# Altium footprint library lib_datalogger.PcbLib: 866 footprints (part 21 of 55)
Each footprint in its own frame and in the unit in brackets; x right, y up, seen from the top. Pads: shape width x height; smd on the part's side, far side on the other; paste and mask are expansions set on the pad; w line width, h text height; cw(c..) or ccw(c..) is an arc to the next point about the centre after c.
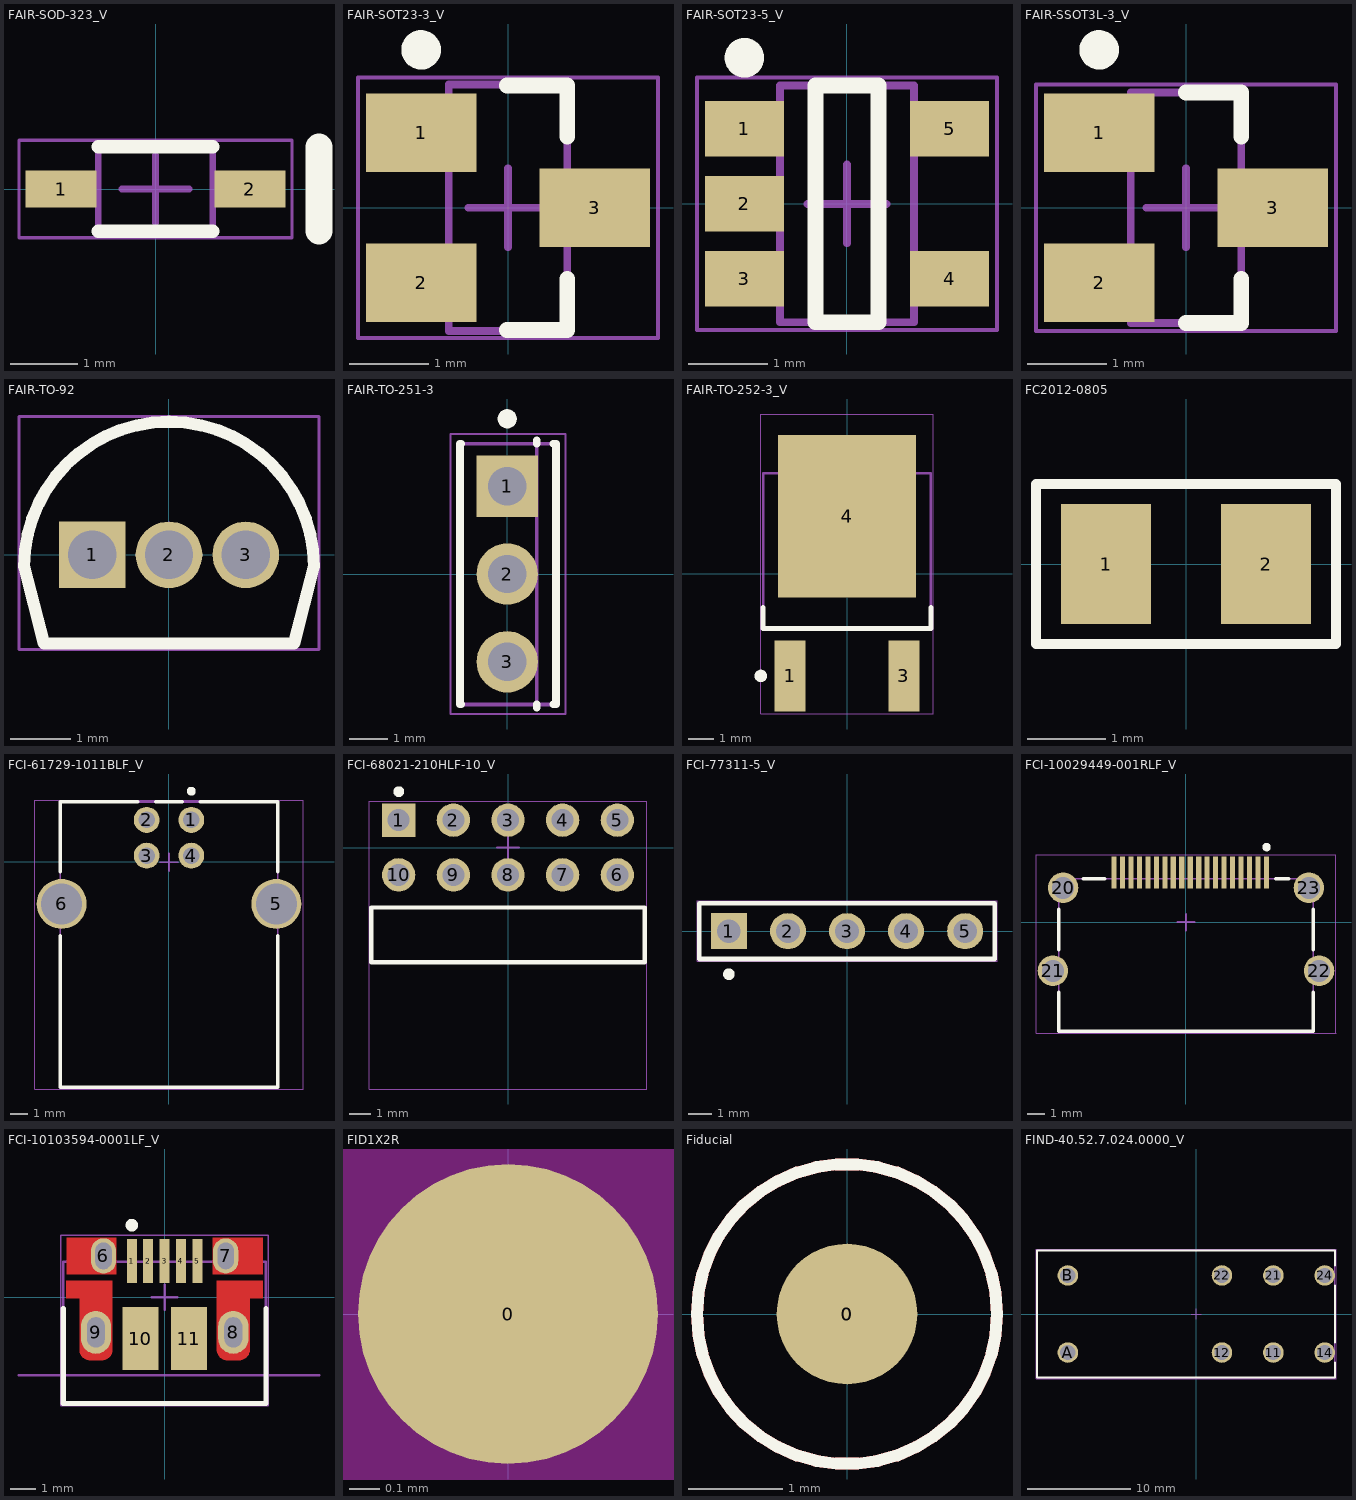
[diagram p20: the footprints below, top view; thin cyan lines are the x and y axes]

## FAIR-SOD-323_V [mm] "SODFL, 2-Leads, Body 1.25x1.7mm"
height 1
pads (2):
  rect 1.05x0.55 smd: 1(-1.4,0) 2(1.4,0)
Top Overlay:
  lines w0.2: -0.85,-0.625 0.85,-0.625 ; -0.85,0.625 0.85,0.625
  lines w0.4: 2.425,-0.625 2.425,0.625
Mechanical 13:
  lines w0.1: -0.85,-0.625 -0.85,0.625 0.85,0.625 0.85,-0.625 -0.85,-0.625
Mechanical 15:
  lines w0.05: -2.025,-0.725 -2.025,0.725 2.025,0.725 2.025,-0.725 -2.025,-0.725
  lines w0.1: -0.5,0 0.5,0 ; 0,-0.5 0,0.5
3D body "SODFL250X100-2L.step": height 1, standoff 0, extent -1.25,-0.625 1.25,0.625

## FAIR-SOT23-3_V [mm] "SOT23, 3-Leads, Body 3.12x1.5mm, Pitch 0.95mm"
height 1.2
pads (3):
  rect 1.4x1 smd: 1(-1.1,0.95) 2(-1.1,-0.95) 3(1.1,0)
Top Overlay:
  circle w0.25: c-1.1,2 r0.125
  lines w0.2: -0.013,-1.55 0.75,-1.55 0.75,-0.9 ; -0.013,1.55 0.75,1.55 0.75,0.9
Mechanical 13:
  lines w0.1: -0.75,-1.56 -0.75,1.56 0.75,1.56 0.75,-1.56 -0.75,-1.56
Mechanical 15:
  lines w0.05: -1.9,-1.65 -1.9,1.65 1.9,1.65 1.9,-1.65 -1.9,-1.65
  lines w0.1: -0.5,0 0.5,0 ; 0,-0.5 0,0.5
3D body "SOT95P240X120-3L.step": height 1.2, standoff 0, extent -1.35,-1.56 1.35,1.56

## FAIR-SOT23-5_V [mm] "SOT23, 5-Leads, Body 3x1.7mm, Pitch 0.95mm"
height 1.45
pads (5):
  rect 1x0.7 smd: 1(-1.3,0.95) 2(-1.3,0) 3(-1.3,-0.95) 4(1.3,-0.95) 5(1.3,0.95)
Top Overlay:
  circle w0.25: c-1.3,1.85 r0.125
  lines w0.2: -0.4,-1.5 -0.4,1.5 0.4,1.5 0.4,-1.5 -0.4,-1.5
Mechanical 13:
  lines w0.1: -0.85,-1.5 0.85,-1.5 0.85,1.5 -0.85,1.5 -0.85,-1.5
Mechanical 15:
  lines w0.05: -1.9,-1.6 1.9,-1.6 1.9,1.6 -1.9,1.6 -1.9,-1.6
  lines w0.1: -0.5,0 0.5,0 ; 0,-0.5 0,0.5
3D body "SOT95P280X145-5L.step": height 1.45, standoff 0, extent -1.5,-1.5 1.5,1.5

## FAIR-SSOT3L-3_V [mm] "SOT23, 3-Leads, Body 2.92x1.4mm, Pitch 0.95mm"
height 1.12
pads (3):
  rect 1.4x1 smd: 1(-1.1,0.95) 2(-1.1,-0.95) 3(1.1,0)
Top Overlay:
  circle w0.25: c-1.1,2 r0.125
  lines w0.2: 0,-1.46 0.7,-1.46 0.7,-0.9 ; 0,1.46 0.7,1.46 0.7,0.9
Mechanical 13:
  lines w0.1: -0.7,-1.46 -0.7,1.46 0.7,1.46 0.7,-1.46 -0.7,-1.46
Mechanical 15:
  lines w0.05: -1.9,-1.56 -1.9,1.56 1.9,1.56 1.9,-1.56 -1.9,-1.56
  lines w0.1: -0.5,0 0.5,0 ; 0,-0.5 0,0.5
3D body "FAIR-SSOT3L-3_V.stp": height 1.12, standoff 0, extent -1.26,-1.46 1.26,1.46

## FAIR-TO-92 [mm] "TO, 3-Leads, Body Dia 4.79mm, Pitch 1.27mm"
height 5.33
pads (3):
  rect 1.1x1.1 hole 0.8: 1(-1.27,0)
  round 1.1 hole 0.8: 2(0,0) 3(1.27,0)
Top Overlay:
  lines w0.2: -2.395,-0.195 cw(c0,-0.195) 2.395,-0.195 2.065,-1.47 -2.065,-1.47 -2.395,-0.195
Mechanical 13:
  lines w0.1: -2.065,-1.47 2.065,-1.47 ; -2.065,-1.47 -2.395,-0.195 cw(c0,-0.195) 2.395,-0.195 2.065,-1.47
Mechanical 15:
  lines w0.05: -2.48,-1.57 -2.48,2.285 2.48,2.285 2.48,-1.57 -2.48,-1.57
  lines w0.1: -0.5,0 0.5,0 ; 0,-0.5 0,0.5
3D body "TO-92.stp": height 4.82, standoff -14.41, extent -2.38,-1.47 2.38,2.185

## FAIR-TO-251-3 [mm] "FM, 3-Leads, Body 6.8x2.5mm, Pitch 2.29mm"
height 9.7
pads (3):
  rect 1.6x1.6 hole 1: 1(0,2.29)
  round 1.6 hole 1: 2(0,0) 3(0,-2.29)
Top Overlay:
  circle w0.25: c0,4.05 r0.125
  lines w0.2: -1.2,-3.4 -1.23,-3.4 -1.23,3.4 -1.2,3.4 ; 0.77,-3.49 0.77,-3.4 ; 0.77,3.4 0.77,3.49 ; 1.2,-3.4 1.27,-3.4 1.27,3.4 1.2,3.4
Mechanical 13:
  lines w0.1: 0.77,-3.4 0.77,3.4 ; -1.23,-3.4 1.27,-3.4 1.27,3.4 -1.23,3.4 -1.23,-3.4
Mechanical 15:
  lines w0.05: -1.48,-3.65 1.52,-3.65 1.52,3.65 -1.48,3.65 -1.48,-3.65
  lines w0.1: -0.5,0 0.5,0 ; 0,-0.5 0,0.5
3D body: height 9.7, standoff 8.8, extent 0.77,-2.675 1.27,2.675
3D body: height 8.8, standoff 1.6, extent -1.23,-3.4 1.27,3.4
3D body: height 0, standoff -1.6, extent -0.25,-2.67 0.25,-1.91
3D body: height 1.6, standoff 0, extent -0.25,-2.765 0.25,-1.815
3D body: height 0, standoff -1.6, extent -0.25,-0.38 0.25,0.38
3D body: height 1.6, standoff 0, extent -0.25,-0.475 0.25,0.475
3D body: height 0, standoff -1.6, extent -0.25,1.91 0.25,2.67
3D body: height 1.6, standoff 0, extent -0.25,1.815 0.25,2.765

## FAIR-TO-252-3_V [mm] "D-PAK, 3-Leads, Body 6.22x6.73mm, Pitch 2.28mm"
height 2.39
pads (3):
  rect 1.25x2.85 smd: 1(-2.28,-4.1) 3(2.28,-4.1)
  rect 5.55x6.5 smd: 4(0,2.3)
Top Overlay:
  circle w0.25: c-3.455,-4.1 r0.125
  lines w0.2: -3.365,-1.35 -3.365,-2.2 3.365,-2.2 3.365,-1.35
Mechanical 13:
  lines w0.1: -3.365,-2.2 -3.365,4.02 3.365,4.02 3.365,-2.2 -3.365,-2.2
Mechanical 15:
  lines w0.05: -3.465,-5.625 -3.465,6.4 3.465,6.4 3.465,-5.625 -3.465,-5.625
  lines w0.1: -0.5,0 0.5,0 ; 0,-0.5 0,0.5
3D body "DPAK229P991X239-3L.step": height 2.39, standoff 0, extent -3.365,-3.555 3.365,6.35

## FC2012-0805 [mil] "Ferrite Chip"
height 33.46
pads (2):
  rect 45x60 smd: 1(-40,0) 2(40,0)
Top Overlay:
  lines w5: -75,-40 -75,40 75,40 75,-40 -75,-40
3D body "User Library-ind_0805.STEP": height 37.4, standoff 0, extent -39.37,-23.62 39.37,23.63

## FCI-61729-1011BLF_V [mm] "THD, 4-Leads, Body 16x12.2mm"
height 11.5
pads (6):
  round 1.45 hole 0.92: 1(1.25,2.355) 2(-1.25,2.355) 3(-1.25,0.355) 4(1.25,0.355)
  round 2.8 hole 2.3: 5(6.02,-2.355) 6(-6.02,-2.355)
Top Overlay:
  circle w0.25: c1.25,3.965 r0.125
  lines w0.2: -6.1,-4.153 -6.1,-12.635 6.1,-12.635 6.1,-4.153 ; -6.1,-0.557 -6.1,3.365 -1.746,3.365 ; -0.75,3.365 0.75,3.365 ; 1.75,3.365 6.1,3.365 6.1,-0.557
Mechanical 13:
  lines w0.1: -6.1,-12.635 6.1,-12.635 6.1,3.365 -6.1,3.365 -6.1,-12.635
Mechanical 15:
  lines w0.05: -7.52,-12.735 7.52,-12.735 7.52,3.465 -7.52,3.465 -7.52,-12.735
  lines w0.1: -0.5,-0.02 0.5,-0.02 ; 0,-0.52 0,0.48
3D body "User Library-i61729-xxxxx_cust.STEP": height 11, standoff -2.8, extent -6.56,-12.575 6.56,3.365

## FCI-68021-210HLF-10_V [mm] "THD, 10-Leads, Body 12.7x2.54mm, Pitch 2.54mm"
height 4.83
pads (10):
  rect 1.55x1.55 hole 1.02: 1(-5.08,1.27)
  round 1.55 hole 1.02: 2(-2.54,1.27) 3(0,1.27) 4(2.54,1.27) 5(5.08,1.27) 6(5.08,-1.27) 7(2.54,-1.27) 8(0,-1.27) 9(-2.54,-1.27) 10(-5.08,-1.27)
Top Overlay:
  circle w0.25: c-5.08,2.595 r0.125
  lines w0.2: -6.35,-5.33 -6.35,-2.79 6.35,-2.79 6.35,-5.33 -6.35,-5.33
Mechanical 13:
  lines w0.1: -6.35,-5.33 -6.35,-2.79 6.35,-2.79 6.35,-5.33 -6.35,-5.33
Mechanical 15:
  lines w0.05: -6.45,-11.225 6.45,-11.225 6.45,2.145 -6.45,2.145 -6.45,-11.225
  lines w0.1: -0.5,0 0.5,0 ; 0,-0.5 0,0.5
3D body "User Library-68021-x10.STEP": height 4.83, standoff -3.06, extent -6.32,-11.125 6.32,1.638

## FCI-77311-5_V [mm] "THD, 5-Leads, Body 12.7x2.4mm, Pitch 2.54mm"
height 16.24
pads (5):
  rect 1.55x1.55 hole 1.02: 1(-5.08,0)
  round 1.55 hole 1.02: 2(-2.54,0) 3(0,0) 4(2.54,0) 5(5.08,0)
Top Overlay:
  circle w0.25: c-5.08,-1.85 r0.125
  lines w0.2: -6.35,-1.2 6.35,-1.2 6.35,1.2 -6.35,1.2 -6.35,-1.2
Mechanical 13:
  lines w0.1: -6.35,-1.2 -6.35,1.2 6.35,1.2 6.35,-1.2 -6.35,-1.2
Mechanical 15:
  lines w0.05: -6.45,-1.3 6.45,-1.3 6.45,1.3 -6.45,1.3 -6.45,-1.3
  lines w0.1: -0.5,0 0.5,0 ; 0,-0.5 0,0.5
3D body: height 2.54, standoff 0, extent -6.35,-1.2 6.35,1.2
3D body: height 16.24, standoff -3.05, extent -0.31,-0.31 0.31,0.31
3D body: height 16.24, standoff -3.05, extent -2.85,-0.31 -2.23,0.31
3D body: height 16.24, standoff -3.05, extent -5.39,-0.31 -4.77,0.31
3D body: height 16.24, standoff -3.05, extent 2.23,-0.31 2.85,0.31
3D body: height 16.24, standoff -3.05, extent 4.77,-0.31 5.39,0.31

## FCI-10029449-001RLF_V [mm] "SMD, 19-Leads, Body 15x9mm, Pitch 0.5mm"
height 6.3
pads (23):
  rect 0.3x1.9 smd: 1(4.75,2.925) 2(4.25,2.925) 3(3.75,2.925) 4(3.25,2.925) 5(2.75,2.925) 6(2.25,2.925) 7(1.75,2.925) 8(1.25,2.925) 9(0.75,2.925) 10(0.25,2.925) 11(-0.25,2.925) 12(-0.75,2.925) 13(-1.25,2.925) 14(-1.75,2.925) 15(-2.25,2.925) 16(-2.75,2.925) 17(-3.25,2.925) 18(-3.75,2.925) 19(-4.25,2.925)
  round 1.8 hole 1.3: 20(-7.25,2.025) 21(-7.85,-2.875) 22(7.85,-2.875) 23(7.25,2.025)
Top Overlay:
  circle w0.25: c4.75,4.425 r0.125
  lines w0.2: -7.5,-4.127 -7.5,-6.445 7.5,-6.445 7.5,-4.127 ; -7.5,-1.623 -7.5,0.749 ; -6.063,2.555 -4.8,2.555 ; 5.3,2.555 6.063,2.555 ; 7.5,-1.623 7.5,0.749
Mechanical 13:
  lines w0.1: -7.5,-6.445 7.5,-6.445 7.5,2.555 -7.5,2.555 -7.5,-6.445
Mechanical 15:
  lines w0.05: -8.85,-6.545 -8.85,3.975 8.85,3.975 8.85,-6.545 -8.85,-6.545
  lines w0.1: -0.5,0 0.5,0 ; 0,-0.5 0,0.5
3D body "10029449-001LF.stp": height 6.11, standoff -1.89, extent -8.1,-6.445 8.1,3.455

## FCI-10103594-0001LF_V [mm] "SMD, 5-Leads, Body 8.04x5.62mm, Pitch 0.65 mm"
height 3.24
pads (11):
  rect 0.4x1.75 smd: 1(-1.3,1.435) 2(-0.65,1.435) 3(0,1.435) 4(0.65,1.435) 5(1.3,1.435)
  oval 1x1.4 hole 0.65 slot 1.05 at 90 deg: 6(-2.425,1.64) 7(2.425,1.64)
  oval 1.2x1.7 hole 0.7 slot 1.2 at 90 deg: 8(2.725,-1.39) 9(-2.725,-1.39)
  rect 1.425x2.5 smd: 10(-0.962,-1.64) 11(0.962,-1.64)
Top Layer:
  rectangle: -3.9,0.91 -1.9,2.37
  region: 3.9,2.37 1.9,2.37 1.9,0.91 3.9,0.91
  region: -3.375,-0.04 -3.375,-2.09 -3.373,-2.129 -3.369,-2.167 -3.365,-2.185 -3.359,-2.203 -3.348,-2.239 -3.329,-2.277 -3.308,-2.312 -3.284,-2.344 -3.258,-2.374 -3.227,-2.401 -3.194,-2.426 -3.158,-2.446 -3.121,-2.464 -3.08,-2.477 -3.049,-2.483 -3.012,-2.488 -2.975,-2.49 -2.475,-2.49 -2.432,-2.488 -2.391,-2.482 -2.351,-2.471 -2.312,-2.456 -2.28,-2.439 -2.249,-2.421 -2.217,-2.397 -2.19,-2.37 -2.164,-2.342 -2.143,-2.312 -2.121,-2.277 -2.105,-2.241 -2.093,-2.209 -2.088,-2.192 -2.084,-2.175 -2.08,-2.155 -2.076,-2.134 -2.075,-2.112 -2.075,-2.09 -2.075,-0.04 -2.075,0.66 -3.9,0.66 -3.9,-0.04
  region: 3.375,-0.04 3.375,-2.09 3.373,-2.129 3.369,-2.167 3.365,-2.185 3.359,-2.203 3.348,-2.239 3.329,-2.277 3.308,-2.312 3.284,-2.344 3.258,-2.374 3.227,-2.401 3.194,-2.426 3.158,-2.446 3.121,-2.464 3.08,-2.477 3.049,-2.483 3.012,-2.488 2.975,-2.49 2.475,-2.49 2.432,-2.488 2.391,-2.481 2.351,-2.471 2.312,-2.456 2.28,-2.439 2.249,-2.421 2.217,-2.396 2.19,-2.37 2.164,-2.342 2.143,-2.312 2.121,-2.277 2.105,-2.241 2.093,-2.209 2.088,-2.192 2.084,-2.175 2.08,-2.155 2.076,-2.134 2.075,-2.112 2.075,-2.09 2.075,-0.04 2.075,0.66 3.9,0.66 3.9,-0.04
Top Overlay:
  circle w0.25: c-1.3,2.86 r0.125
  lines w0.2: -4.02,-2.077 -4.02,-4.21 ; -4.02,-0.44 -4.02,-4.21 ; 4.02,-0.44 4.02,-4.21 -4.02,-4.21
Mechanical 1:
  lines w0.1: -5.775,-3.09 6.125,-3.09
  text "PCB Edge" at 4.425,-2.83 h0.75
Mechanical 13:
  lines w0.1: -4.02,-4.21 4.02,-4.21 4.02,1.41 -4.02,1.41 -4.02,-4.21
Mechanical 15:
  lines w0.05: -4.12,-4.31 4.12,-4.31 4.12,2.47 -4.12,2.47 -4.12,-4.31
  lines w0.1: -0.5,0 0.5,0 ; 0,-0.5 0,0.5
3D body "10103594.stp": height 2.9, standoff -0.7, extent -4.02,-4.149 4.02,1.884

## FID1X2R [mm] "Fiducial - Round 1x2mm"
pads (1):
  round 1 smd paste-0.5 mask+0.5: 0(0,0)
Top Layer keep-out:
  circle w1: c0,0 r0.5
  region: 0,0
Top Designator:
  text ".Designator" at -1.27,-0.127 h0.6

## Fiducial [mm] "Fiducial 1.5mm"
pads (2):
  round 1.5 smd: 0(0,0)
  round 3 on Top Solder: 0(0,0)
Top Layer:
  circle w0.127: c0,0 r1.6
Top Overlay:
  circle w0.127: c0,0 r1.6

## FIND-40.52.7.024.0000_V [mm] "Relay, 8-Leads, Body 29x12.4mm"
height 25
pads (8):
  round 2 hole 1.5: 11(7.5,-3.75) 12(2.5,-3.75) 14(12.5,-3.75) 21(7.5,3.75) 22(2.5,3.75) 24(12.5,3.75) A(-12.5,-3.75) B(-12.5,3.75)
Top Overlay:
  lines w0.2: 13.5,-4.73 13.5,-6.2 -15.5,-6.2 -15.5,6.2 13.5,6.2 13.5,4.73 ; 13.5,-2.77 13.5,2.77
Mechanical 13:
  lines w0.1: -15.5,-6.2 13.5,-6.2 13.5,6.2 -15.5,6.2 -15.5,-6.2
Mechanical 15:
  lines w0.05: -15.6,-6.3 13.6,-6.3 13.6,6.3 -15.6,6.3 -15.6,-6.3
  lines w0.1: -0.5,0 0.5,0 ; 0,-0.5 0,0.5
3D body "4052.stp": height 25, standoff -5.3, extent -15.5,-6.2 13.5,6.2